# Altium footprint library SENSOR.PcbLib: 76 footprints (part 3 of 5)
Each footprint in its own frame and in the unit in brackets; x right, y up, seen from the top. Pads: shape width x height; smd on the part's side, far side on the other; paste and mask are expansions set on the pad; w line width, h text height; cw(c..) or ccw(c..) is an arc to the next point about the centre after c.
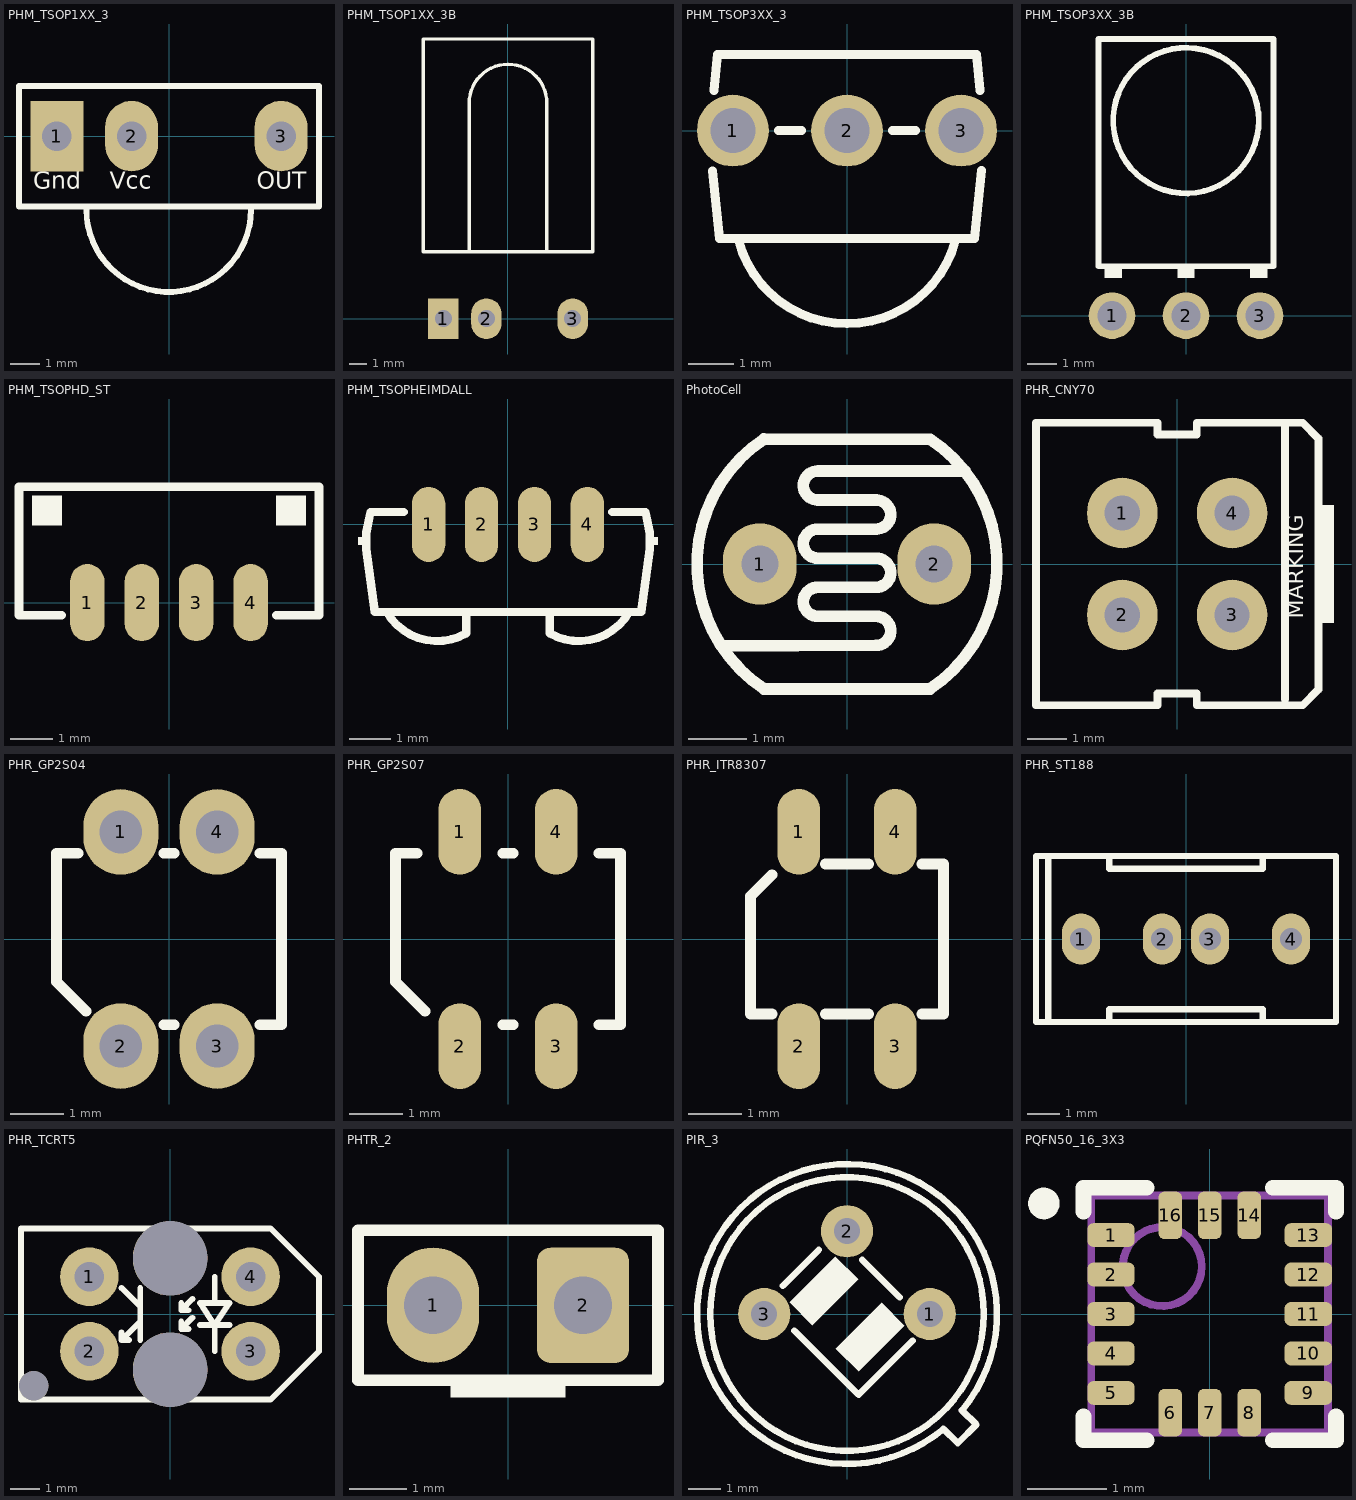
[diagram p2: the footprints below, top view; thin cyan lines are the x and y axes]

## PHM_TSOP1XX_3 [mm] "Photo Modules for PCM Remote Control Systems"
pads (3):
  rect 1.8x2.4 hole 1: 1(-3.81,0)
  oval 1.8x2.4 hole 1: 2(-1.27,0) 3(3.81,0)
Top Overlay:
  lines w0.2: -2.81,-2.5 ccw(c-0.01,-2.5) 2.79,-2.5 ; -5.1,-2.4 5.1,-2.4 5.1,1.7 -5.1,1.7 -5.1,-2.4
  text "Gnd" at -4.61,-2 h1
  text "Vcc" at -2.01,-2 h1
  text "OUT" at 2.99,-2 h1
3D body "TSOPxxxx.STEP": height 13.25, standoff -17.35, extent -5.01,-5.15 4.99,1.6

## PHM_TSOP1XX_3B [mm] "IR Sensor (TV Sensor)"
pads (3):
  rect 1.8x2.4 hole 1: 1(-3.81,0)
  oval 1.8x2.4 hole 1: 2(-1.27,0) 3(3.81,0)
Top Overlay:
  lines w0.2: -2.286,3.937 -2.286,12.7 cw(c0,12.7) 2.286,12.7 2.286,3.937 ; -5,3.937 -5,16.471 5,16.471 5,3.937 -5,3.937
3D body "TSOP1238_2009.STEP": height 5.8, standoff -2.15, extent -5,-0.229 5,16.471

## PHM_TSOP3XX_3 [mm] "HS0038B, SFH5110, TSOP322.., TSOP324.., TSOP344.., TSOP348.."
height 6.95
pads (3):
  round 1.6 / inner round 1.6 / far side oval 1.6x2.4 hole 1: 1(-2.54,0) 2(0,0) 3(2.54,0)
Top Overlay:
  lines w0.2: -2.99,-0.899 -2.84,-2.4 2.84,-2.4 2.991,-0.889 ; -2.96,0.896 -2.88,1.7 2.88,1.7 2.96,0.896 ; -2.415,-2.447 ccw(c0,-1.8) 2.415,-2.447 ; -1.524,0 -1.016,0 ; 1.016,0 1.524,0
3D body "User Library-tsop4836.step": height 10.51, standoff -20, extent -3,-4.2 3,1.6

## PHM_TSOP3XX_3B [mm] "TSOP3XX_BENDED"
height 10
pads (3):
  round 1.6 / inner round 1.6 / far side oval 1.6x2.4 hole 1: 1(-2.54,0) 2(0,0) 3(2.54,0)
Top Overlay:
  circle w0.2: c0,6.7 r2.5
  rectangle: -2.8,1.3 -2.2,1.7
  rectangle: -0.3,1.3 0.3,1.7
  region: 2.8,1.7 2.2,1.7 2.2,1.3 2.8,1.3
  lines w0.2: -3,1.7 -3,9.5 3,9.5 3,1.7 -3,1.7
3D body "SFH5110.STEP": height 6.95, standoff -3.6, extent -2.9,-0.2 2.9,9.4

## PHM_TSOPHD_ST [mm] "HEIMDALL, TSOP952-4, TSOP753-4, TSOP773-4 ... straight"
height 3
pads (4):
  oval 0.8x1.8 smd paste-0.1: 1(-1.905,0) 2(-0.635,0) 3(0.635,0) 4(1.905,0)
Top Overlay:
  region: 3.2,2.5 2.5,2.5 2.5,1.8 3.2,1.8
  rectangle: -3.2,1.8 -2.5,2.5
  lines w0.2: -2.5,-0.3 -3.5,-0.3 -3.5,2.7 3.5,2.7 3.5,-0.3 2.5,-0.3
3D body "Heimdall.stp": height 3.16, standoff -0.04, extent -3.45,-0.438 3.45,2.662

## PHM_TSOPHEIMDALL [mm] "HEIMDALL, TSOP952-4, TSOP753-4, TSOP773-4 ... RightAngle"
height 3
pads (4):
  oval 0.8x1.8 smd paste-0.1: 1(-1.905,0) 2(-0.635,0) 3(0.635,0) 4(1.905,0)
Top Overlay:
  region: -3.4,-0.3 -3.6,-0.3 -3.6,-0.5 -3.4,-0.5
  rectangle: 3.4,-0.5 3.6,-0.3
  lines w0.2: -2.909,-2.105 ccw(c-1.7,-1.4) -0.995,-2.609 ; -2.5,0.3 -3.3,0.3 -3.4,-0.2 -3.4,-0.6 -3.2,-2.1 3.2,-2.1 3.4,-0.6 3.4,-0.2 3.3,0.3 2.5,0.3 ; -1,-2.609 -1,-2.1 ; 0.995,-2.609 ccw(c1.7,-1.4) 2.909,-2.105 ; 1,-2.609 1,-2.1
3D body "Heimdall.stp": height 3.13, standoff 0.03, extent -3.45,-2.7 3.45,0.5

## PhotoCell [mm]
pads (2):
  oval 1.27x1.397 hole 0.635: 1(-1.5,0) 2(1.5,0)
Top Overlay:
  lines w0.2: -2.16,-1.41 0.5,-1.4 ccw(c0.502,-1.15) 0.501,-0.9 -0.5,-0.9 cw(c-0.502,-0.65) -0.5,-0.4 0.5,-0.4 ccw(c0.502,-0.15) 0.501,0.1 -0.5,0.1 cw(c-0.502,0.35) -0.5,0.6 0.5,0.6 ccw(c0.502,0.85) 0.501,1.1 -0.499,1.1 ; -1.43,-2.15 1.429,-2.15 ; -1.43,2.15 1.429,2.148 cw(c0,0) 1.428,-2.149 ; -1.429,-2.148 cw(c0,0) -1.429,2.148 ; -0.5,1.1 cw(c-0.501,1.35) -0.499,1.6 2.03,1.6
3D body "LDR.STEP": height 2.44, standoff -2.3, extent -2.605,-2.159 2.605,2.141

## PHR_CNY70 [mm] "PHOTO, Reflective Optical Sensor, CNY70"
pads (4):
  round 1.8 hole 0.9: 1(-1.4,1.3) 2(-1.4,-1.3) 3(1.4,-1.3) 4(1.4,1.3)
Top Overlay:
  rectangle: 3.6,-1.5 4,1.5
  lines w0.2: 2.75,-3.45 2.75,3.55 ; -3.6,-3.6 -3.6,3.6 -0.5,3.6 -0.5,3.3 0.5,3.3 0.5,3.6 3.2,3.6 3.6,3.2 3.6,-3.2 3.2,-3.6 0.5,-3.6 0.5,-3.3 -0.5,-3.3 -0.5,-3.6 -3.6,-3.6
  text "MARKING" at 3.35,-1.4 h0.7
3D body "CNY70.step": height 6, standoff -5.75, extent -3.5,-3.5 3.5,3.5

## PHR_GP2S04 [mm] "PHOTO, Reflective Optical Sensor, GP2S04"
pads (4):
  oval 1.4x1.6 hole 0.8: 1(-0.9,2) 2(-0.9,-2) 3(0.9,-2) 4(0.9,2)
Top Overlay:
  lines w0.2: -1.7,1.6 -2.1,1.6 -2.1,-0.8 -1.55,-1.35 ; -0.1,-1.6 0.1,-1.6 ; -0.1,1.6 0.1,1.6 ; 1.7,-1.6 2.1,-1.6 2.1,1.6 1.7,1.6
3D body: height 1.7, standoff 0, extent -2,-1.5 2,1.5
3D body: height 1.3, standoff 0, extent 0.2,-1.2 1.7,1.2
3D body: height 1.65, standoff 1.35, extent 0.2,-1.2 1.7,1.2
3D body: height 1.7, standoff 0, extent -0.2,-1.2 0.2,1.2
3D body: height 1.65, standoff 1.35, extent -1.7,-1.2 -0.2,1.2
3D body: height 1.3, standoff 0, extent -1.7,-1.2 -0.2,1.2

## PHR_GP2S07 [mm] "PHOTO, Reflective Optical Sensor, GP2S07"
pads (4):
  oval 0.8x1.6 smd: 1(-0.9,2) 2(-0.9,-2) 3(0.9,-2) 4(0.9,2)
Top Overlay:
  lines w0.2: -1.7,1.6 -2.1,1.6 -2.1,-0.8 -1.55,-1.35 ; -0.1,-1.6 0.1,-1.6 ; -0.1,1.6 0.1,1.6 ; 1.7,-1.6 2.1,-1.6 2.1,1.6 1.7,1.6
3D body: height 1.3, standoff 0, extent -1.7,-1.2 -0.2,1.2
3D body: height 1.65, standoff 1.35, extent -1.7,-1.2 -0.2,1.2
3D body: height 1.7, standoff 0, extent -0.2,-1.2 0.2,1.2
3D body: height 1.65, standoff 1.35, extent 0.2,-1.2 1.7,1.2
3D body: height 1.3, standoff 0, extent 0.2,-1.2 1.7,1.2
3D body: height 1.7, standoff 0, extent -2,-1.5 2,1.5

## PHR_ITR8307 [mm] "PHOTO, Reflective Optical Sensor, ITR8307"
pads (4):
  oval 0.8x1.6 smd: 1(-0.9,2) 2(-0.9,-2) 3(0.9,-2) 4(0.9,2)
Top Overlay:
  lines w0.2: -1.4,-1.4 -1.8,-1.4 -1.8,0.8 -1.4,1.2 ; -0.4,-1.4 0.4,-1.4 ; -0.4,1.4 0.4,1.4 ; 1.4,-1.4 1.8,-1.4 1.8,1.4 1.4,1.4
3D body: height 1.5, standoff 0, extent -1.7,-1.35 1.7,1.35

## PHR_ST188 [mm] "PHOTO, Reflective Optical Sensor, ST188"
height 8.2
pads (4):
  oval 1.2x1.6 hole 0.7: 1(-3.29,0) 2(-0.75,0) 3(0.75,0) 4(3.29,0)
Top Overlay:
  lines w0.2: -4.318,-2.6 -4.318,2.6 ; -2.4,-2.6 -2.4,-2.2 2.4,-2.2 2.4,-2.55 ; -2.4,2.6 -2.4,2.2 2.4,2.2 2.4,2.55 ; -4.7,-2.6 4.7,-2.6 4.7,2.6 -4.7,2.6 -4.7,-2.6
3D body "CircuitWorks-LED DIP 3MM.step": height 8.3, standoff -0.2, extent -3.92,-1.9 -0.42,1.9
3D body "CircuitWorks-LED DIP 3MM.step": height 8.3, standoff -0.2, extent 0.12,-1.9 3.62,1.9
3D body: height 8.2, standoff 0, extent -3.7,2.3 -2.3,2.5
3D body: height 8.2, standoff 0, extent -3.7,1.5 4.5,2.3
3D body: height 8.2, standoff 0, extent -4.5,-2.5 -3.7,2.5
3D body: height 8.2, standoff 0, extent 3.5,-1.5 4.5,1.5
3D body: height 8.2, standoff 0, extent -3.7,-2.3 4.5,-1.5
3D body: height 8.2, standoff 0, extent -0.5,-1.5 0.5,1.5
3D body: height 8.2, standoff 0, extent 2.3,2.3 4.5,2.5
3D body: height 8.2, standoff 0, extent 2.3,-2.5 4.5,-2.3
3D body: height 8.2, standoff 0, extent -3.7,-2.5 -2.3,-2.3
3D body: height 3, standoff 0, extent -2.3,-2.5 2.3,-2.3
3D body: height 3, standoff 0, extent -2.3,2.3 2.3,2.5
3D body: height 2, standoff -3, extent -3.49,-0.2 -3.09,0.2
3D body: height 2, standoff -3, extent -0.95,-0.2 -0.55,0.2
3D body: height 2, standoff -3, extent 0.55,-0.2 0.95,0.2
3D body: height 2, standoff -3, extent 3.09,-0.2 3.49,0.2

## PHR_TCRT5 [mm] "PHOTO, Reflective Optical Sensor (Vishay) tcrt5000"
pads (7):
  round 2 hole 1: 1(-2.75,1.27) 2(-2.75,-1.27) 3(2.75,-1.27) 4(2.75,1.27)
  round 1 hole 1 unplated: ""(-4.65,-2.45)
  round 2.54 hole 2.54 unplated: ""(0,-1.9) ""(0,1.9)
Top Overlay:
  lines w0.2: -1.651,-0.635 -1.651,-0.889 ; -1.651,0.889 -1.016,0.254 ; -1.397,-0.889 -1.651,-0.889 ; -1.016,-0.889 -1.016,0.889 ; -1.016,-0.254 -1.651,-0.889 ; 0.381,-0.254 0.381,-0.508 ; 0.381,0.381 0.381,0.127 ; 0.635,-0.508 0.381,-0.508 ; 0.635,0.127 0.381,0.127 ; 0.762,-0.127 0.381,-0.508 ; 0.762,0.508 0.381,0.127 ; 1.016,-0.381 2.032,-0.381 ; 1.524,-1.27 1.524,-0.381 ; 1.524,0.381 1.524,1.27 ; 1.524,-0.381 2.032,0.381 1.016,0.381 1.524,-0.381 ; -5.08,-2.921 3.429,-2.921 5.08,-1.27 5.08,1.27 3.429,2.921 -5.08,2.921 -5.08,-2.921
3D body "User Library-esfera de encaixe-1.step": height 6.25, standoff -5, extent 0.35,-1.25 2.85,1.25
3D body "User Library-esfera de encaixe-1.step": height 6.25, standoff -5, extent -2.85,-1.25 -0.35,1.25
3D body "User Library-corpo TCRT 5000.step": height 7.6, standoff -2.9, extent -5.1,-3.4 5.1,3.4

## PHTR_2 [mm] "Photransistor, PT534-6B"
pads (2):
  oval 1.6x2 hole 1: 1(-1.3,0)
  rrect30% 1.6x2 hole 1: 2(1.3,0)
Top Overlay:
  rectangle: -1,-1.6 1,-1.3
  lines w0.2: -2.6,-1.3 2.6,-1.3 2.6,1.3 -2.6,1.3 -2.6,-1.3
3D body: height 7.5, standoff 2.5, extent -2.5,-1.25 2.5,1.25
3D body: height 5, standoff 0, extent -2.5,-1.25 2.5,1.25
3D body: height 1, standoff -3, extent 1.05,-0.25 1.55,0.25
3D body: height 1, standoff -4, extent -1.55,-0.25 -1.05,0.25

## PIR_3 [mm] "PIR Sensors, D203B, D203S, D204B, D204S"
height 4.7
pads (3):
  round 1.6 hole 0.8: 1(2.54,0) 2(0,2.54) 3(-2.54,0)
Top Overlay:
  circle w0.2: c0,0 r4.2
  region: 1.061,0.354 -0.354,-1.061 0.353,-1.768 1.768,-0.354
  region: -0.354,1.768 -1.768,0.354 -1.061,-0.354 0.353,1.061
  lines w0.2: -1.964,0.864 -0.864,1.964 ; -1.611,-0.511 0.354,-2.475 2.014,-0.814 ; 0.461,1.661 1.611,0.511 ; 2.957,-3.524 cw(c0,0) 3.524,-2.957 3.97,-3.39 3.4,-3.96 2.957,-3.524
Mechanical 1:
  lines w0.2: 3.522,-2.956 3.536,-2.956
3D body "PIR_S_Orginal.STEP": height 4.7, standoff -2, extent -4.537,-4.54 4.563,4.559

## PQFN50_16_3X3 [mm] "16 Lead LGA (3x3x0.75) ICM20601"
height 0.8
pads (16):
  rrect50% 0.6x0.3 smd paste-0.05 mask+0.05: 1(-1.25,1) 2(-1.25,0.5) 3(-1.25,0) 4(-1.25,-0.5) 5(-1.25,-1) 9(1.25,-1) 10(1.25,-0.5) 11(1.25,0) 12(1.25,0.5) 13(1.25,1)
  rrect50% 0.3x0.6 smd paste-0.05 mask+0.05: 6(-0.5,-1.25) 7(0,-1.25) 8(0.5,-1.25) 14(0.5,1.25) 15(0,1.25) 16(-0.5,1.25)
Top Overlay:
  circle w0.2: c-2.1,1.4 r0.1
  lines w0.2: -1.6,-1.3 -1.6,-1.6 -0.8,-1.6 ; -1.6,1.3 -1.6,1.6 -0.8,1.6 ; 0.8,-1.6 1.6,-1.6 1.6,-1.3 ; 0.8,1.6 1.6,1.6 1.6,1.3
Mechanical 13:
  circle w0.1: c-0.6,0.6 r0.5
  lines w0.1: -1.5,-1.5 1.5,-1.5 1.5,1.5 -1.5,1.5 -1.5,-1.5
3D body "PQFN50_16_3X3.step": height 0.8, standoff 0, extent -1.5,-1.5 1.5,1.5